# Altium schematic symbol library LATTICEPLDS_Library.SchLib: 291 symbols (part 30 of 32) (continued)
## LFXP10E-5F256C (continued)
part A text: BANK 7; BANK 6; LFXP10E (fpBGA256); (1 OF 5)
part B text: BANK 5; BANK 4; LFXP10E (fpBGA256); (2 OF 5)
part C text: BANK 3; BANK 2; LFXP10E (fpBGA256); (3 OF 5)
part D text: BANK 1; BANK 0; LFXP10E (fpBGA256); (4 OF 5)
part E text: LFXP10E (fpBGA256); (5 OF 5)

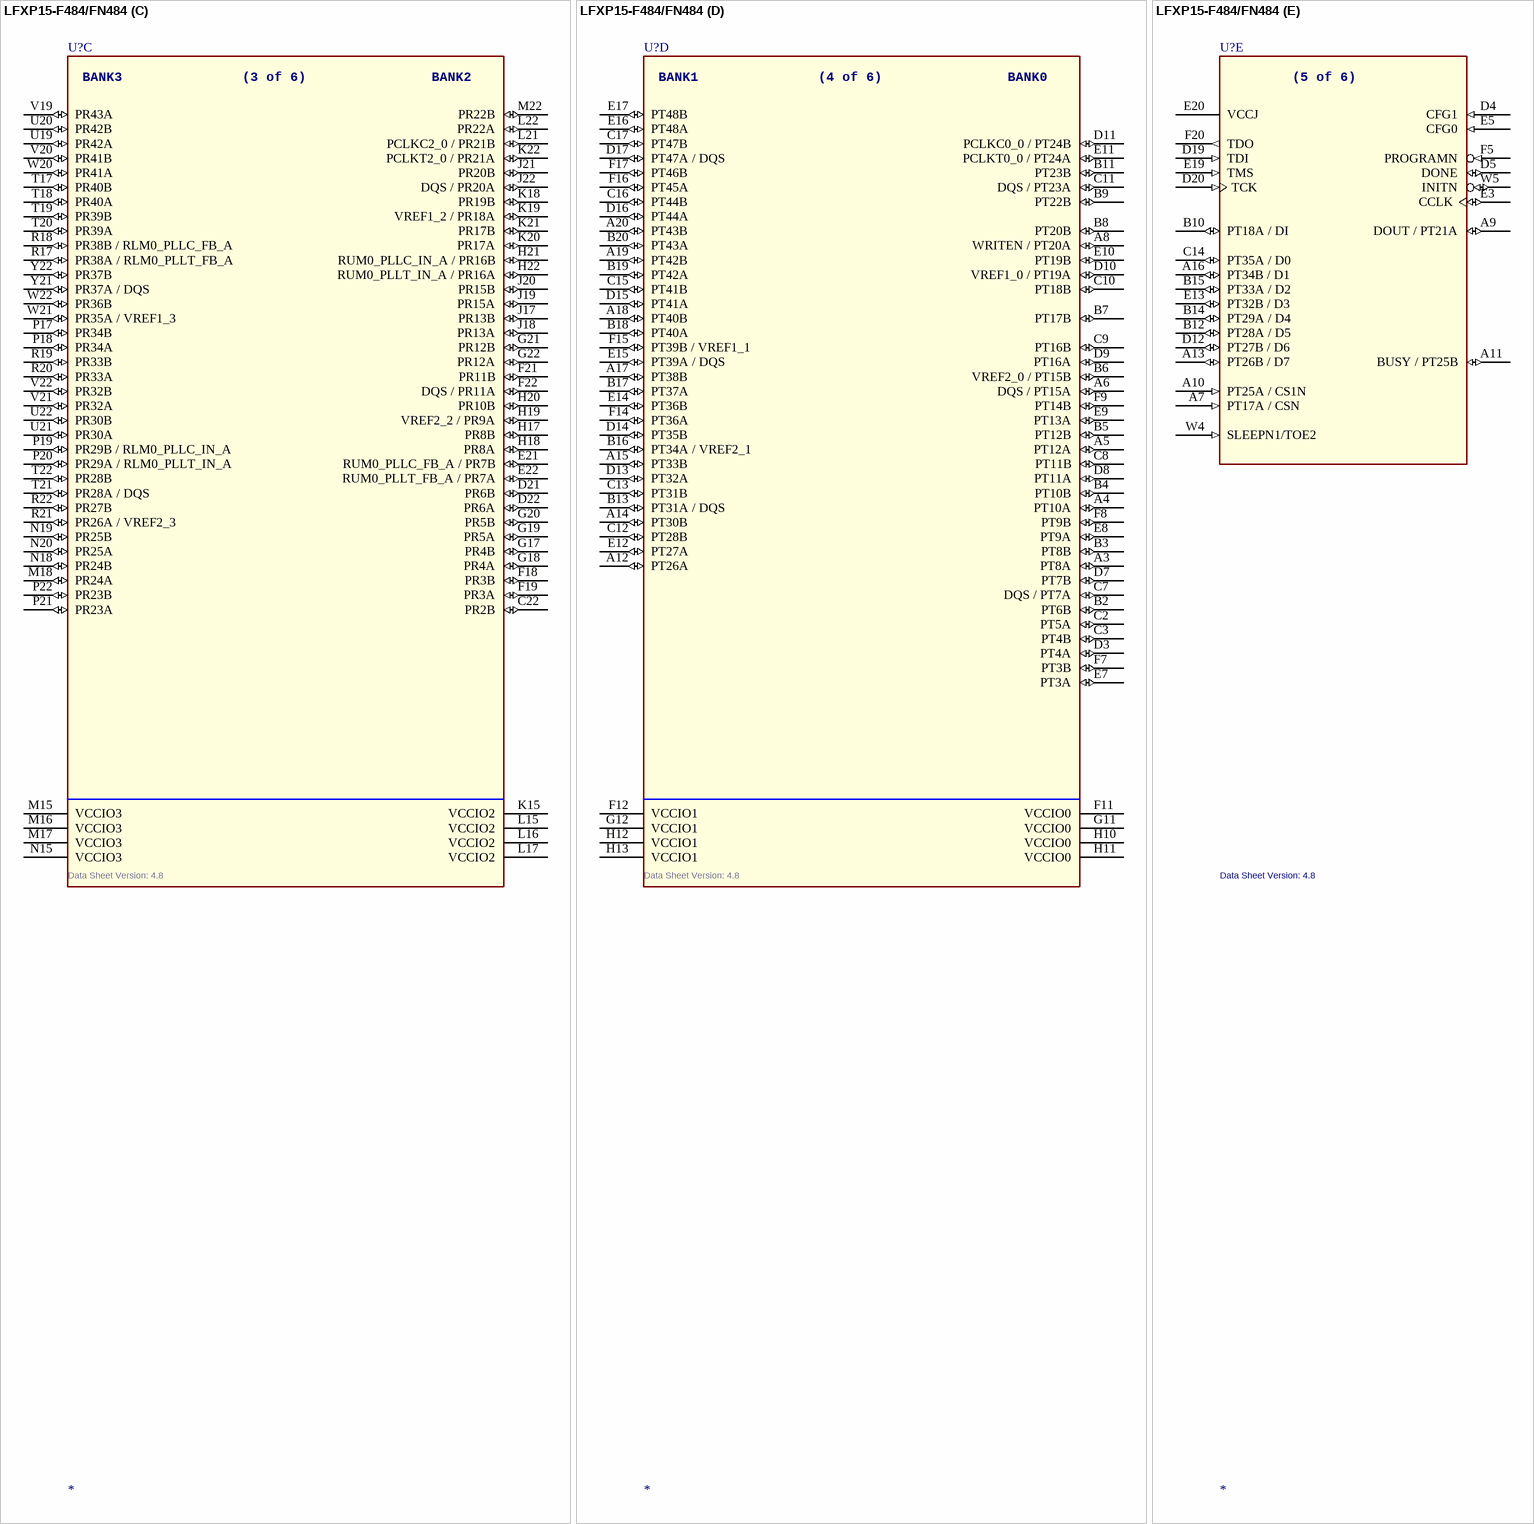
[diagram p275: symbol LFXP15-F484/FN484]

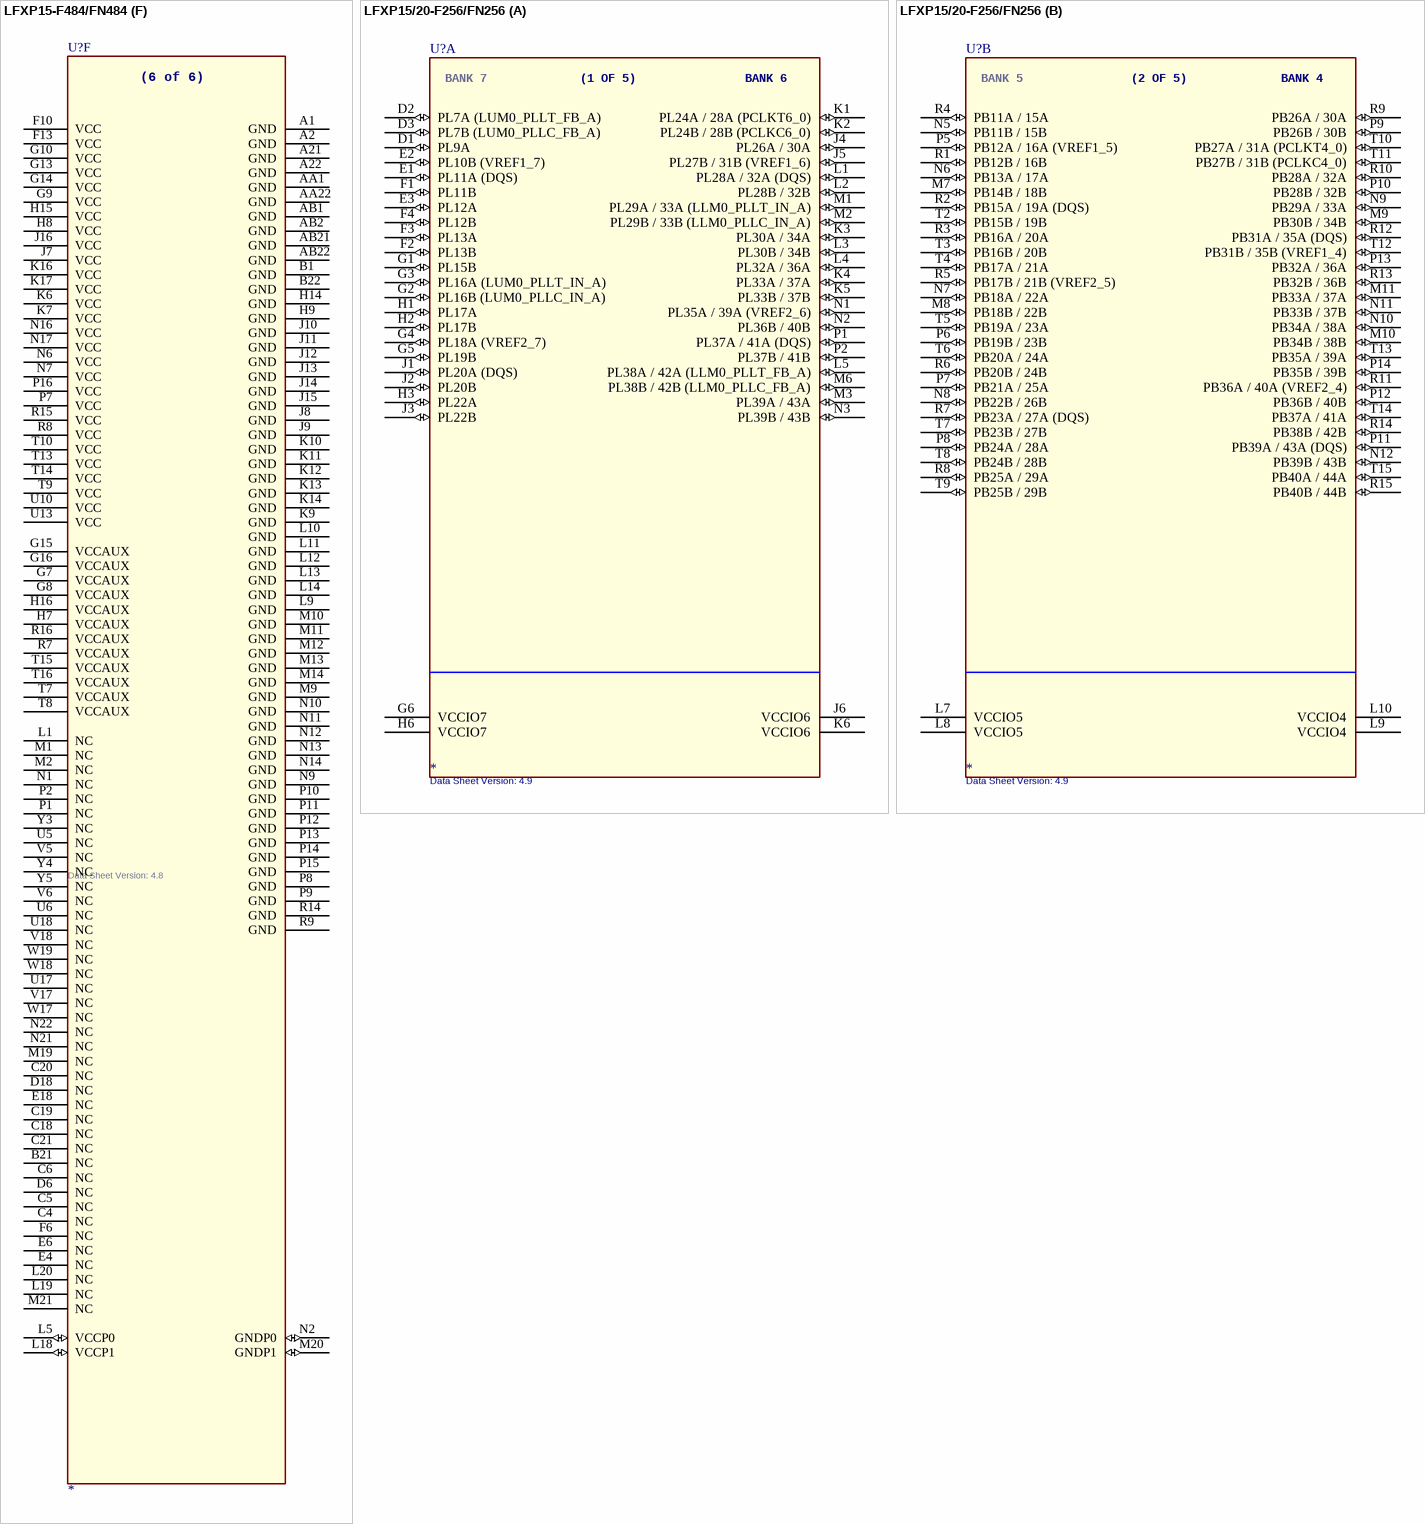
[diagram p276: symbols LFXP15-F484/FN484 to LFXP15/20-F256/FN256]

## LFXP15-F484/FN484
designator U?  Data Sheet Version: 4.8
SWAP_INFO: (S1+S2+S3+S4+S5+S6); SPLIT_INST: TRUE
part A pins: C1 PL2B (io), D1 PL6A (io), D2 PL6B (io), E1 PL7A / LUM0_PLLT_FB_A (io), E2 PL7B / LUM0_PLLC_FB_A (io), F1 PL11A / DQS (io), F2 PL11B (io), F3 PL4B (io), F4 PL4A (io), G1 PL13A (io), G2 PL13B (io), G3 PL5B (io), G4 PL5A (io), G5 PL3A (io), G6 PL3B (io), H1 PL16A / LUM0_PLLT_IN_A (io), H2 PL16B / LUM0_PLLC_IN_A (io), H3 PL10B / VREF1_7 (io), H4 PL9A (io), H5 PL8A (io), H6 PL8B (io), J1 PL17A (io), J2 PL17B (io), J3 PL15B (io), J4 PL15A (io), J5 PL12A (io), J6 PL12B (io), K1 PL21A (io), K2 PL19B (io), K3 PL18A / VREF2_7 (io), K4 PL20A / DQS (io), K5 PL20B (io), K8 VCCIO7 (power), L2 PL21B (io), L3 PL22B (io), L4 PL22A (io), L6 VCCIO7 (power), L7 VCCIO7 (power), L8 VCCIO7 (power), M3 PL23B (io), M4 PL23A (io), M5 PL26A (io), M6 VCCIO6 (power), M7 VCCIO6 (power), M8 VCCIO6 (power), N3 PL25A (io), N4 PL25B (io), N5 VREF1_6 / PL27B (io), N8 VCCIO6 (power), P3 PL30A (io), P4 PL30B (io), P5 PL32B (io), P6 PL32A (io), R1 PCLKC6_0 / PL24B (io), R2 PCLKT6_0 / PL24A (io), R3 VREF2_6 / PL35A (io), R4 PL36B (io), R5 PL37B (io), R6 DQS / PL37A (io), T1 PL28B (io), T2 DQS / PL28A (io), T3 PL39A (io), T4 PL39B (io), T5 PL41B (io), T6 PL41A (io), U1 LLM0_PLLC_IN_A / PL29B (io), U2 LLM0_PLLT_IN_A / PL29A (io), U3 PL42A (io), U4 PL42B (io), V1 PL33B (io), V2 PL33A (io), V3 PL40B (io), V4 PL43A (io), W1 PL34B (io), W2 PL34A (io), W3 PL40A (io), Y1 LLM0_PLLC_FB_A / PL38B (io), Y2 LLM0_PLLT_FB_A / PL38A (io)
part B pins: AA2 PB4A (io), AA3 PB4B (io), AA4 PB8A (io), AA5 PB8B (io), AA6 PB10A (io), AA7 PB10B (io), AA8 PB17A (io), AA9 PB17B / VREF2_5 (io), AA10 PB22B (io), AA11 PB24B (io), AA12 PB26B (io), AA13 PB29A (io), AA14 PB33A (io), AA15 PB33B (io), AA16 PB41A (io), AA17 PB41B (io), AA18 PB42A (io), AA19 PB42B (io), AA20 PB44A (io), AA21 PB44B (io), AB3 PB9A (io), AB4 PB9B (io), AB5 PB16A (io), AB6 PB16B (io), AB7 PB19A (io), AB8 PB19B (io), AB9 PB20A (io), AB10 PB20B (io), AB11 PB25A (io), AB12 PB25B (io), AB13 PB28A (io), AB14 PB28B (io), AB15 DQS / PB31A (io), AB16 VREF1_4 / PB31B (io), AB17 PB34A (io), AB18 PB34B (io), AB19 PB37A (io), AB20 PB38B (io), R10 VCCIO5 (power), R11 VCCIO5 (power), R12 VCCIO4 (power), R13 VCCIO4 (power), T11 VCCIO5 (power), T12 VCCIO4 (power), U7 PB6B (io), U8 PB11A (io), U9 PB14B (io), U11 VCCIO5 (power), U12 VCCIO4 (power), U14 VREF2_4 / PB36A (io), U15 PB39B (io), U16 PB48B (io), V7 PB5A (io), V8 PB11B (io), V9 PB13A (io), V10 PB18B (io), V11 PB23B (io), V12 PCLKC4_0 / PB27B (io), V13 PB32A (io), V14 PB36B (io), V15 DQS / PB39A (io), V16 PB48A (io), W6 PB3A (io), W7 PB7B (io), W8 PB12B (io), W9 PB15B (io), W10 PB18A (io), W11 PB23A / DQS (io), W12 PCLKT4_0 / PB27A (io), W13 PB32B (io), W14 PB35A (io), W15 PB40B (io), W16 PB43B (io), Y6 PB3B (io), Y7 PB7A / DQS (io), Y8 PB12A / VREF1_5 (io), Y9 PB15A / DQS (io), Y10 PB21A (io), Y11 PB24A (io), Y12 PB26A (io), Y13 PB30B (io), Y14 PB35B (io), Y15 PB40A (io), Y16 PB43A (io), Y17 PB45A (io), Y18 PB46B (io), Y19 DQS / PB47A (io), Y20 PB47B (io)
part C pins: C22 PR2B (io), D21 PR6B (io), D22 PR6A (io), E21 RUM0_PLLC_FB_A / PR7B (io), E22 RUM0_PLLT_FB_A / PR7A (io), F18 PR3B (io), F19 PR3A (io), F21 PR11B (io), F22 DQS / PR11A (io), G17 PR4B (io), G18 PR4A (io), G19 PR5A (io), G20 PR5B (io), G21 PR12B (io), G22 PR12A (io), H17 PR8B (io), H18 PR8A (io), H19 VREF2_2 / PR9A (io), H20 PR10B (io), H21 RUM0_PLLC_IN_A / PR16B (io), H22 RUM0_PLLT_IN_A / PR16A (io), J17 PR13B (io), J18 PR13A (io), J19 PR15A (io), J20 PR15B (io), J21 PR20B (io), J22 DQS / PR20A (io), K15 VCCIO2 (power), K18 PR19B (io), K19 VREF1_2 / PR18A (io), K20 PR17A (io), K21 PR17B (io), K22 PCLKT2_0 / PR21A (io), L15 VCCIO2 (power), L16 VCCIO2 (power), L17 VCCIO2 (power), L21 PCLKC2_0 / PR21B (io), L22 PR22A (io), M15 VCCIO3 (power), M16 VCCIO3 (power), M17 VCCIO3 (power), M18 PR24A (io), M22 PR22B (io), N15 VCCIO3 (power), N18 PR24B (io), N19 PR25B (io), N20 PR25A (io), P17 PR34B (io), P18 PR34A (io), P19 PR29B / RLM0_PLLC_IN_A (io), P20 PR29A / RLM0_PLLT_IN_A (io), P21 PR23A (io), P22 PR23B (io), R17 PR38A / RLM0_PLLT_FB_A (io), R18 PR38B / RLM0_PLLC_FB_A (io), R19 PR33B (io), R20 PR33A (io), R21 PR26A / VREF2_3 (io), R22 PR27B (io), T17 PR40B (io), T18 PR40A (io), T19 PR39B (io), T20 PR39A (io), T21 PR28A / DQS (io), T22 PR28B (io), U19 PR42A (io), U20 PR42B (io), U21 PR30A (io), U22 PR30B (io), V19 PR43A (io), V20 PR41B (io), V21 PR32A (io), V22 PR32B (io), W20 PR41A (io), W21 PR35A / VREF1_3 (io), W22 PR36B (io), Y21 PR37A / DQS (io), Y22 PR37B (io)
part D pins: A3 PT8A (io), A4 PT10A (io), A5 PT12A (io), A6 DQS / PT15A (io), A8 WRITEN / PT20A (io), A12 PT26A (io), A14 PT30B (io), A15 PT33B (io), A17 PT38B (io), A18 PT40B (io), A19 PT42B (io), A20 PT43B (io), B2 PT6B (io), B3 PT8B (io), B4 PT10B (io), B5 PT12B (io), B6 VREF2_0 / PT15B (io), B7 PT17B (io), B8 PT20B (io), B9 PT22B (io), B11 PT23B (io), B13 PT31A / DQS (io), B16 PT34A / VREF2_1 (io), B17 PT37A (io), B18 PT40A (io), B19 PT42A (io), B20 PT43A (io), C2 PT5A (io), C3 PT4B (io), C7 DQS / PT7A (io), C8 PT11B (io), C9 PT16B (io), C10 PT18B (io), C11 DQS / PT23A (io), C12 PT28B (io), C13 PT31B (io), C15 PT41B (io), C16 PT44B (io), C17 PT47B (io), D3 PT4A (io), D7 PT7B (io), D8 PT11A (io), D9 PT16A (io), D10 VREF1_0 / PT19A (io), D11 PCLKC0_0 / PT24B (io), D13 PT32A (io), D14 PT35B (io), D15 PT41A (io), D16 PT44A (io), D17 PT47A / DQS (io), E7 PT3A (io), E8 PT9A (io), E9 PT13A (io), E10 PT19B (io), E11 PCLKT0_0 / PT24A (io), E12 PT27A (io), E14 PT36B (io), E15 PT39A / DQS (io), E16 PT48A (io), E17 PT48B (io), F7 PT3B (io), F8 PT9B (io), F9 PT14B (io), F11 VCCIO0 (power), F12 VCCIO1 (power), F14 PT36A (io), F15 PT39B / VREF1_1 (io), F16 PT45A (io), F17 PT46B (io), G11 VCCIO0 (power), G12 VCCIO1 (power), H10 VCCIO0 (power), H11 VCCIO0 (power), H12 VCCIO1 (power), H13 VCCIO1 (power)
part E pins: A7 PT17A / CSN (in), A9 DOUT / PT21A (io), A10 PT25A / CS1N (in), A11 BUSY / PT25B (io), A13 PT26B / D7 (io), A16 PT34B / D1 (io), B10 PT18A / DI (io), B12 PT28A / D5 (io), B14 PT29A / D4 (io), B15 PT33A / D2 (io), C14 PT35A / D0 (io), D4 CFG1 (in), D5 DONE (io), D12 PT27B / D6 (io), D19 TDI (in), D20 TCK (in), E3 CCLK (io), E5 CFG0 (in), E13 PT32B / D3 (io), E19 TMS (in), E20 VCCJ (power), F5 PROGRAMN (in), F20 TDO (out), W4 SLEEPN1/TOE2 (in), W5 INITN (io)
part F pins: A1 GND (power), A2 GND (power), A21 GND (power), A22 GND (power), AA1 GND (power), AA22 GND (power), AB1 GND (power), AB2 GND (power), AB21 GND (power), AB22 GND (power), B1 GND (power), B21 NC, B22 GND (power), C4 NC, C5 NC, C6 NC, C18 NC, C19 NC, C20 NC, C21 NC, D6 NC, D18 NC, E4 NC, E6 NC, E18 NC, F6 NC, F10 VCC (power), F13 VCC (power), G7 VCCAUX (power), G8 VCCAUX (power), G9 VCC (power), G10 VCC (power), G13 VCC (power), G14 VCC (power), G15 VCCAUX (power), G16 VCCAUX (power), H7 VCCAUX (power), H8 VCC (power), H9 GND (power), H14 GND (power), H15 VCC (power), H16 VCCAUX (power), J7 VCC (power), J8 GND (power), J9 GND (power), J10 GND (power), J11 GND (power), J12 GND (power), J13 GND (power), J14 GND (power), J15 GND (power), J16 VCC (power), K6 VCC (power), K7 VCC (power), K9 GND (power), K10 GND (power), K11 GND (power), K12 GND (power), K13 GND (power), K14 GND (power), K16 VCC (power), K17 VCC (power), L1 NC, L5 VCCP0 (io), L9 GND (power), L10 GND (power), L11 GND (power), L12 GND (power), L13 GND (power), L14 GND (power), L18 VCCP1 (io), L19 NC, L20 NC, M1 NC, M2 NC, M9 GND (power), M10 GND (power), M11 GND (power), M12 GND (power), M13 GND (power), M14 GND (power), M19 NC, M20 GNDP1 (io), M21 NC, N1 NC, N2 GNDP0 (io), N6 VCC (power), N7 VCC (power), N9 GND (power), N10 GND (power), N11 GND (power), N12 GND (power), N13 GND (power), N14 GND (power), N16 VCC (power), N17 VCC (power), N21 NC, N22 NC, P1 NC, P2 NC, P7 VCC (power), P8 GND (power), P9 GND (power), P10 GND (power), P11 GND (power), P12 GND (power), P13 GND (power), P14 GND (power), P15 GND (power), P16 VCC (power), R7 VCCAUX (power), R8 VCC (power), R9 GND (power), R14 GND (power), R15 VCC (power), R16 VCCAUX (power), T7 VCCAUX (power), T8 VCCAUX (power), T9 VCC (power), T10 VCC (power), T13 VCC (power), T14 VCC (power), T15 VCCAUX (power), T16 VCCAUX (power), U5 NC, U6 NC, U10 VCC (power), U13 VCC (power), U17 NC, U18 NC, V5 NC, V6 NC, V17 NC, V18 NC, W17 NC, W18 NC, W19 NC, Y3 NC, Y4 NC, Y5 NC
part A text: BANK7; (1 of 6); BANK6
part B text: BANK5; (2 of 6); BANK4
part C text: BANK3; (3 of 6); BANK2
part D text: BANK1; (4 of 6); BANK0
part E text: (5 of 6)
part F text: (6 of 6)

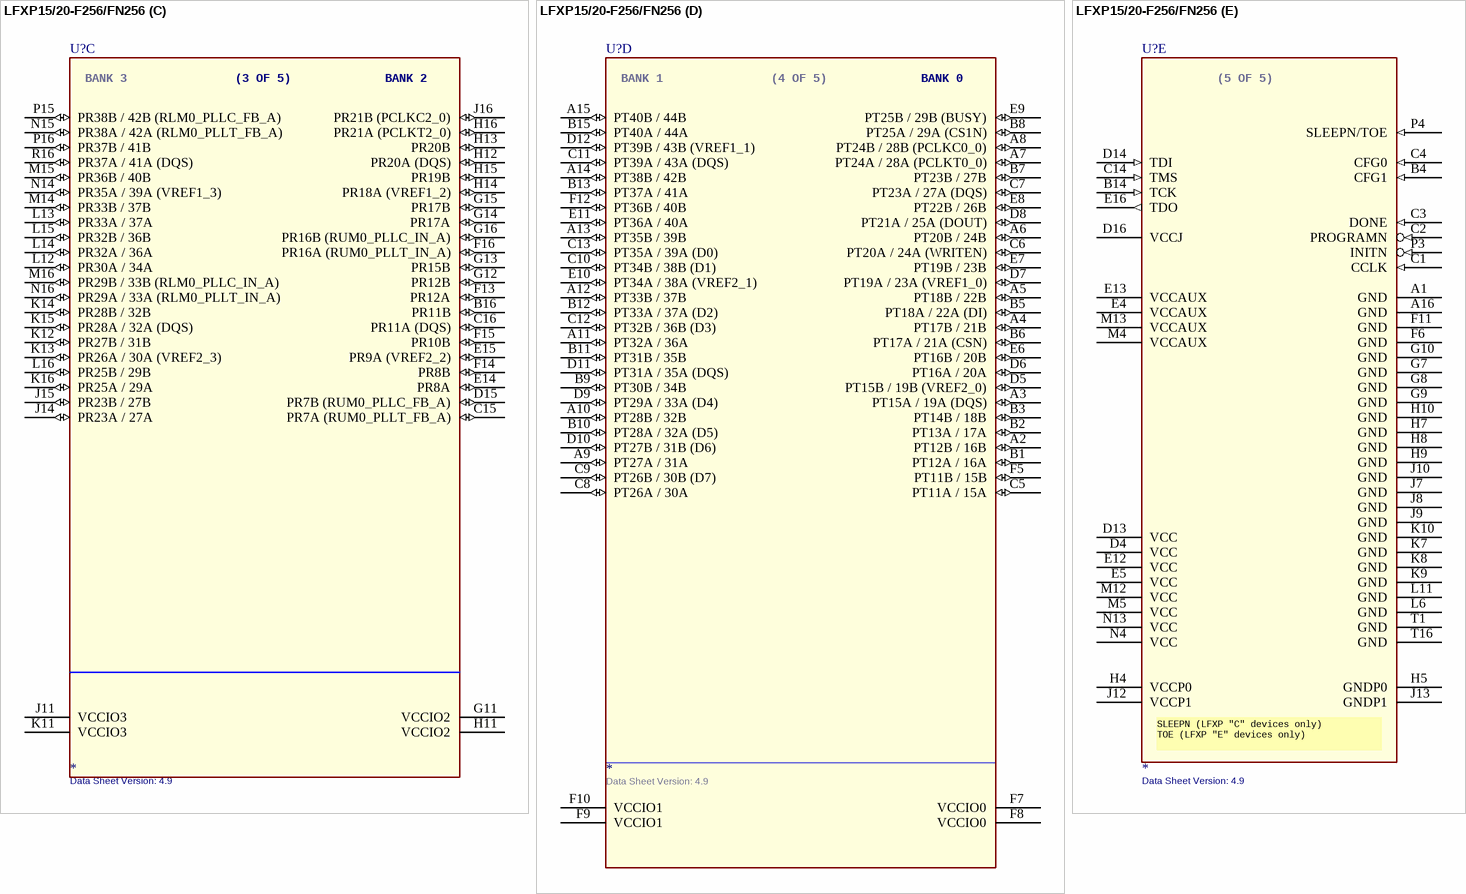
[diagram p277: symbol LFXP15/20-F256/FN256]

## LFXP15/20-F256/FN256
designator U?  Data Sheet Version: 4.9
SPLIT_INST: TRUE; SWAP_INFO: (S1+S2+S3+S4+S5)
part A pins: D1 PL9A (io), D2 PL7A (LUM0_PLLT_FB_A) (io), D3 PL7B (LUM0_PLLC_FB_A) (io), E1 PL11A (DQS) (io), E2 PL10B (VREF1_7) (io), E3 PL12A (io), F1 PL11B (io), F2 PL13B (io), F3 PL13A (io), F4 PL12B (io), G1 PL15B (io), G2 PL16B (LUM0_PLLC_IN_A) (io), G3 PL16A (LUM0_PLLT_IN_A) (io), G4 PL18A (VREF2_7) (io), G5 PL19B (io), G6 VCCIO7 (power), H1 PL17A (io), H2 PL17B (io), H3 PL22A (io), H6 VCCIO7 (power), J1 PL20A (DQS) (io), J2 PL20B (io), J3 PL22B (io), J4 PL26A / 30A (io), J5 PL27B / 31B (VREF1_6) (io), J6 VCCIO6 (power), K1 PL24A / 28A (PCLKT6_0) (io), K2 PL24B / 28B (PCLKC6_0) (io), K3 PL30A / 34A (io), K4 PL33A / 37A (io), K5 PL33B / 37B (io), K6 VCCIO6 (power), L1 PL28A / 32A (DQS) (io), L2 PL28B / 32B (io), L3 PL30B / 34B (io), L4 PL32A / 36A (io), L5 PL38A / 42A (LLM0_PLLT_FB_A) (io), M1 PL29A / 33A (LLM0_PLLT_IN_A) (io), M2 PL29B / 33B (LLM0_PLLC_IN_A) (io), M3 PL39A / 43A (io), M6 PL38B / 42B (LLM0_PLLC_FB_A) (io), N1 PL35A / 39A (VREF2_6) (io), N2 PL36B / 40B (io), N3 PL39B / 43B (io), P1 PL37A / 41A (DQS) (io), P2 PL37B / 41B (io)
part B pins: L7 VCCIO5 (power), L8 VCCIO5 (power), L9 VCCIO4 (power), L10 VCCIO4 (power), M7 PB14B / 18B (io), M8 PB18B / 22B (io), M9 PB30B / 34B (io), M10 PB34B / 38B (io), M11 PB33A / 37A (io), N5 PB11B / 15B (io), N6 PB13A / 17A (io), N7 PB18A / 22A (io), N8 PB22B / 26B (io), N9 PB29A / 33A (io), N10 PB34A / 38A (io), N11 PB33B / 37B (io), N12 PB39B / 43B (io), P5 PB12A / 16A (VREF1_5) (io), P6 PB19B / 23B (io), P7 PB21A / 25A (io), P8 PB24A / 28A (io), P9 PB26B / 30B (io), P10 PB28B / 32B (io), P11 PB39A / 43A (DQS) (io), P12 PB36B / 40B (io), P13 PB32A / 36A (io), P14 PB35B / 39B (io), R1 PB12B / 16B (io), R2 PB15A / 19A (DQS) (io), R3 PB16A / 20A (io), R4 PB11A / 15A (io), R5 PB17B / 21B (VREF2_5) (io), R6 PB20B / 24B (io), R7 PB23A / 27A (DQS) (io), R8 PB25A / 29A (io), R9 PB26A / 30A (io), R10 PB28A / 32A (io), R11 PB36A / 40A (VREF2_4) (io), R12 PB31A / 35A (DQS) (io), R13 PB32B / 36B (io), R14 PB38B / 42B (io), R15 PB40B / 44B (io), T2 PB15B / 19B (io), T3 PB16B / 20B (io), T4 PB17A / 21A (io), T5 PB19A / 23A (io), T6 PB20A / 24A (io), T7 PB23B / 27B (io), T8 PB24B / 28B (io), T9 PB25B / 29B (io), T10 PB27A / 31A (PCLKT4_0) (io), T11 PB27B / 31B (PCLKC4_0) (io), T12 PB31B / 35B (VREF1_4) (io), T13 PB35A / 39A (io), T14 PB37A / 41A (io), T15 PB40A / 44A (io)
part C pins: B16 PR11B (io), C15 PR7A (RUM0_PLLT_FB_A) (io), C16 PR11A (DQS) (io), D15 PR7B (RUM0_PLLC_FB_A) (io), E14 PR8A (io), E15 PR9A (VREF2_2) (io), F13 PR12A (io), F14 PR8B (io), F15 PR10B (io), F16 PR16A (RUM0_PLLT_IN_A) (io), G11 VCCIO2 (power), G12 PR12B (io), G13 PR15B (io), G14 PR17A (io), G15 PR17B (io), G16 PR16B (RUM0_PLLC_IN_A) (io), H11 VCCIO2 (power), H12 PR20A (DQS) (io), H13 PR20B (io), H14 PR18A (VREF1_2) (io), H15 PR19B (io), H16 PR21A (PCLKT2_0) (io), J11 VCCIO3 (power), J14 PR23A / 27A (io), J15 PR23B / 27B (io), J16 PR21B (PCLKC2_0) (io), K11 VCCIO3 (power), K12 PR27B / 31B (io), K13 PR26A / 30A (VREF2_3) (io), K14 PR28B / 32B (io), K15 PR28A / 32A (DQS) (io), K16 PR25A / 29A (io), L12 PR30A / 34A (io), L13 PR33A / 37A (io), L14 PR32A / 36A (io), L15 PR32B / 36B (io), L16 PR25B / 29B (io), M14 PR33B / 37B (io), M15 PR36B / 40B (io), M16 PR29B / 33B (RLM0_PLLC_IN_A) (io), N14 PR35A / 39A (VREF1_3) (io), N15 PR38A / 42A (RLM0_PLLT_FB_A) (io), N16 PR29A / 33A (RLM0_PLLT_IN_A) (io), P15 PR38B / 42B (RLM0_PLLC_FB_A) (io), P16 PR37B / 41B (io), R16 PR37A / 41A (DQS) (io)
part D pins: A2 PT12B / 16B (io), A3 PT15A / 19A (DQS) (io), A4 PT17B / 21B (io), A5 PT18B / 22B (io), A6 PT20B / 24B (io), A7 PT24A / 28A (PCLKT0_0) (io), A8 PT24B / 28B (PCLKC0_0) (io), A9 PT27A / 31A (io), A10 PT28B / 32B (io), A11 PT32A / 36A (io), A12 PT33B / 37B (io), A13 PT35B / 39B (io), A14 PT38B / 42B (io), A15 PT40B / 44B (io), B1 PT12A / 16A (io), B2 PT13A / 17A (io), B3 PT14B / 18B (io), B5 PT18A / 22A (DI) (io), B6 PT17A / 21A (CSN) (io), B7 PT23B / 27B (io), B8 PT25A / 29A (CS1N) (io), B9 PT30B / 34B (io), B10 PT28A / 32A (D5) (io), B11 PT31B / 35B (io), B12 PT33A / 37A (D2) (io), B13 PT37A / 41A (io), B15 PT40A / 44A (io), C5 PT11A / 15A (io), C6 PT20A / 24A (WRITEN) (io), C7 PT23A / 27A (DQS) (io), C8 PT26A / 30A (io), C9 PT26B / 30B (D7) (io), C10 PT34B / 38B (D1) (io), C11 PT39A / 43A (DQS) (io), C12 PT32B / 36B (D3) (io), C13 PT35A / 39A (D0) (io), D5 PT15B / 19B (VREF2_0) (io), D6 PT16A / 20A (io), D7 PT19A / 23A (VREF1_0) (io), D8 PT21A / 25A (DOUT) (io), D9 PT29A / 33A (D4) (io), D10 PT27B / 31B (D6) (io), D11 PT31A / 35A (DQS) (io), D12 PT39B / 43B (VREF1_1) (io), E6 PT16B / 20B (io), E7 PT19B / 23B (io), E8 PT22B / 26B (io), E9 PT25B / 29B (BUSY) (io), E10 PT34A / 38A (VREF2_1) (io), E11 PT36A / 40A (io), F5 PT11B / 15B (io), F7 VCCIO0 (power), F8 VCCIO0 (power), F9 VCCIO1 (power), F10 VCCIO1 (power), F12 PT36B / 40B (io)
part E pins: A1 GND (power), A16 GND (power), B4 CFG1 (in), B14 TCK (in), C1 CCLK (in), C2 PROGRAMN (in), C3 DONE (in), C4 CFG0 (in), C14 TMS (in), D4 VCC (power), D13 VCC (power), D14 TDI (in), D16 VCCJ (power), E4 VCCAUX (power), E5 VCC (power), E12 VCC (power), E13 VCCAUX (power), E16 TDO (out), F6 GND (power), F11 GND (power), G7 GND (power), G8 GND (power), G9 GND (power), G10 GND (power), H4 VCCP0 (power), H5 GNDP0 (power), H7 GND (power), H8 GND (power), H9 GND (power), H10 GND (power), J7 GND (power), J8 GND (power), J9 GND (power), J10 GND (power), J12 VCCP1 (power), J13 GNDP1 (power), K7 GND (power), K8 GND (power), K9 GND (power), K10 GND (power), L6 GND (power), L11 GND (power), M4 VCCAUX (power), M5 VCC (power), M12 VCC (power), M13 VCCAUX (power), N4 VCC (power), N13 VCC (power), P3 INITN (in), P4 SLEEPN/TOE (in), T1 GND (power), T16 GND (power)

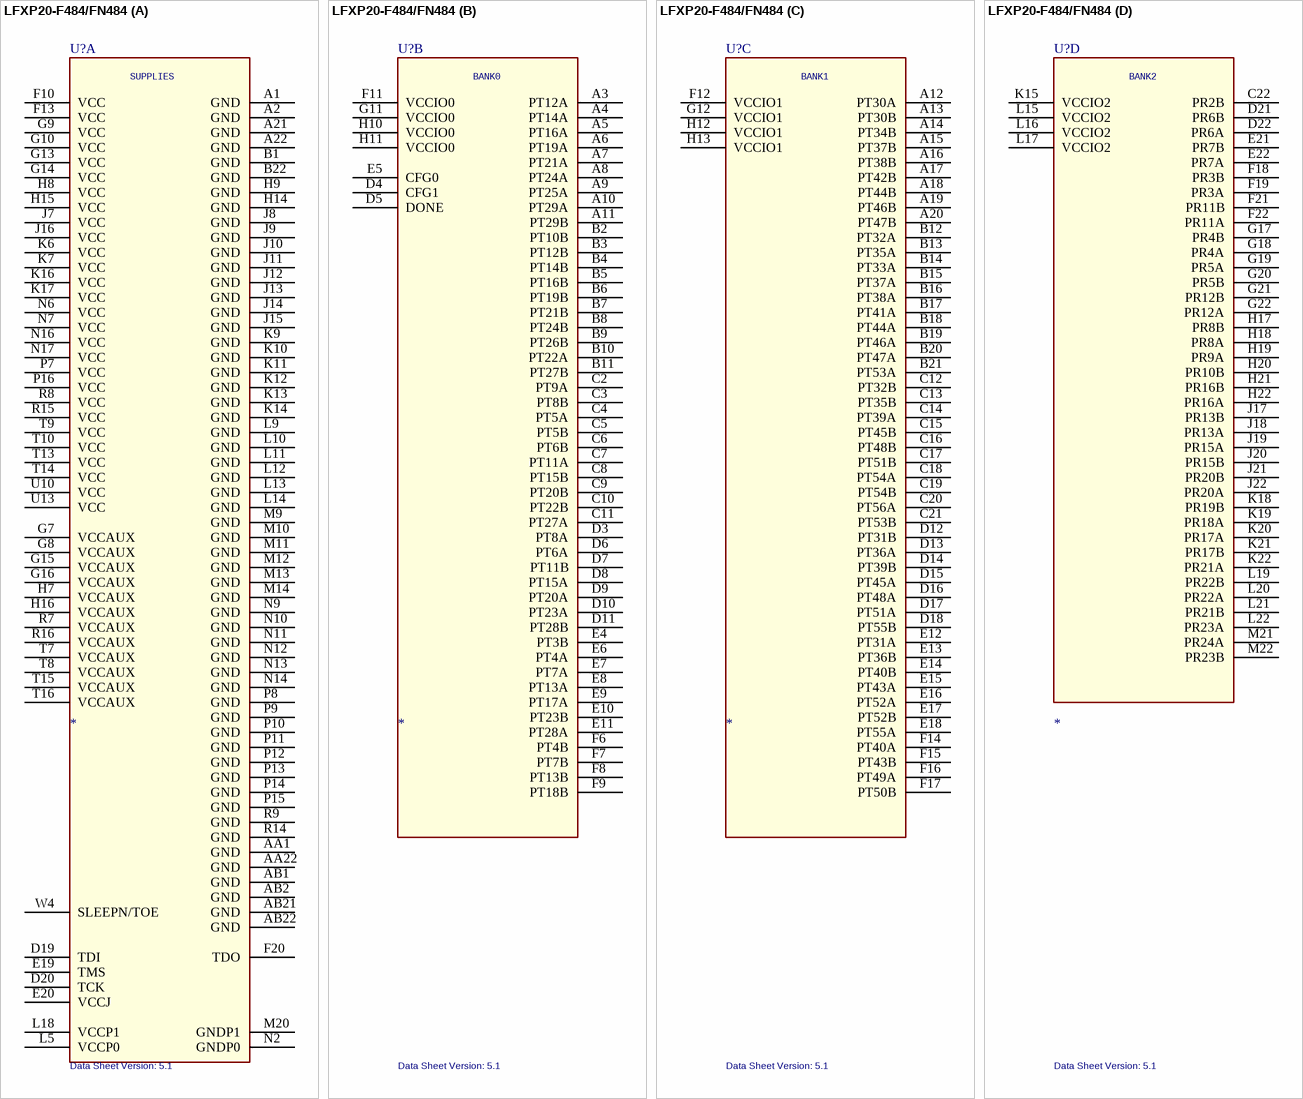
[diagram p278: symbol LFXP20-F484/FN484]

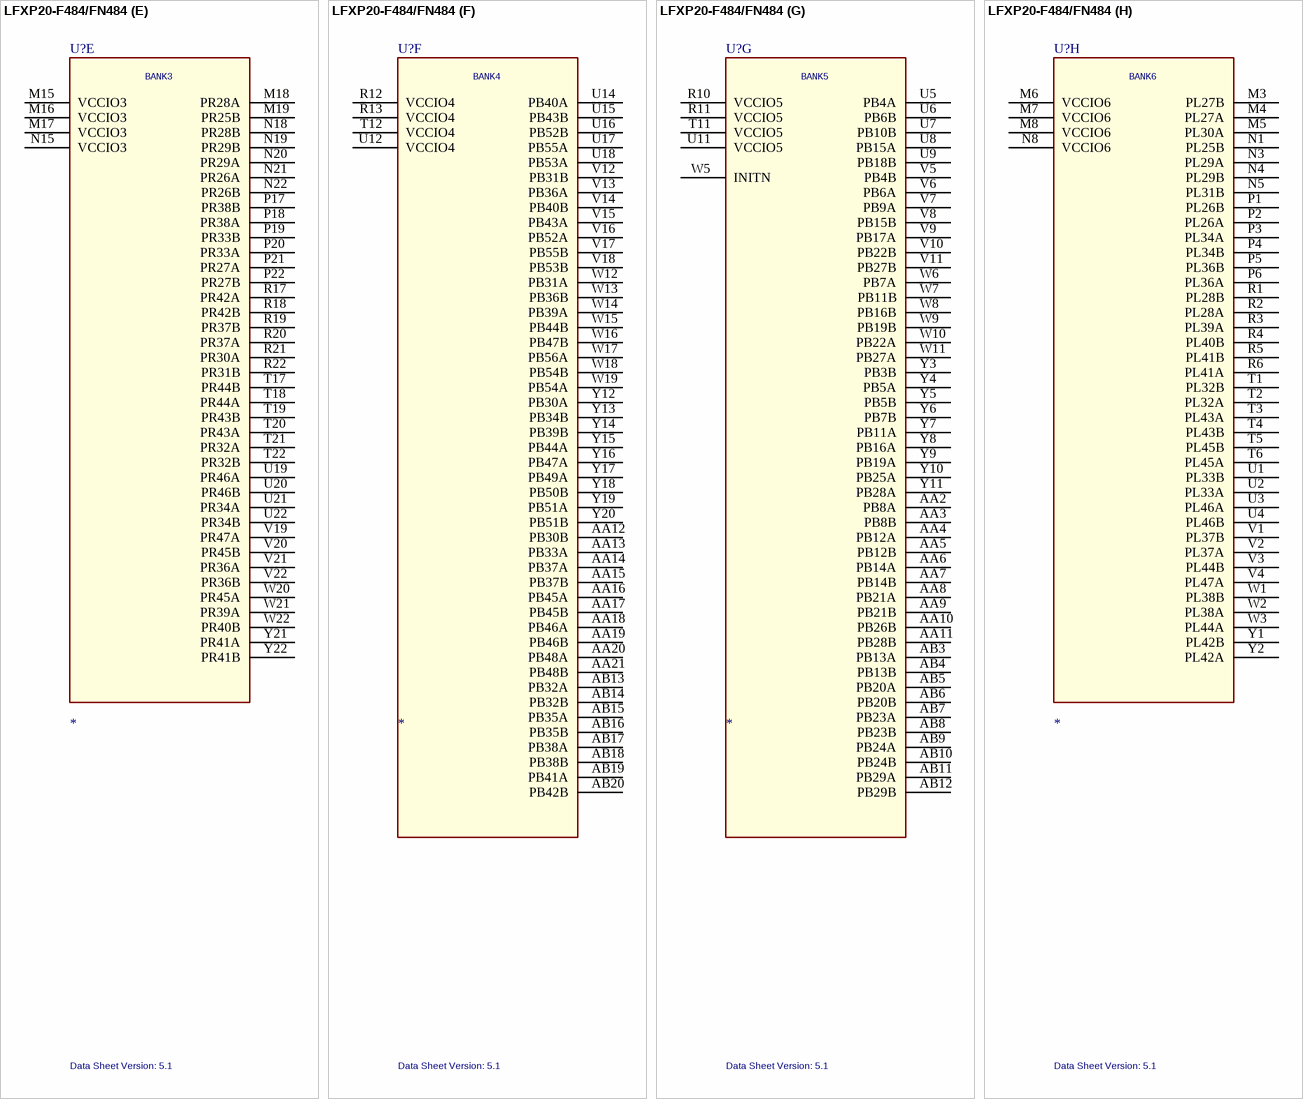
[diagram p279: symbol LFXP20-F484/FN484]
